# Altium footprint library XU-GENARAL PCB .PcbLib: 1176 footprints (part 1 of 75)
Each footprint in its own frame and in the unit in brackets; x right, y up, seen from the top. Pads: shape width x height; smd on the part's side, far side on the other; paste and mask are expansions set on the pad; w line width, h text height; cw(c..) or ccw(c..) is an arc to the next point about the centre after c.
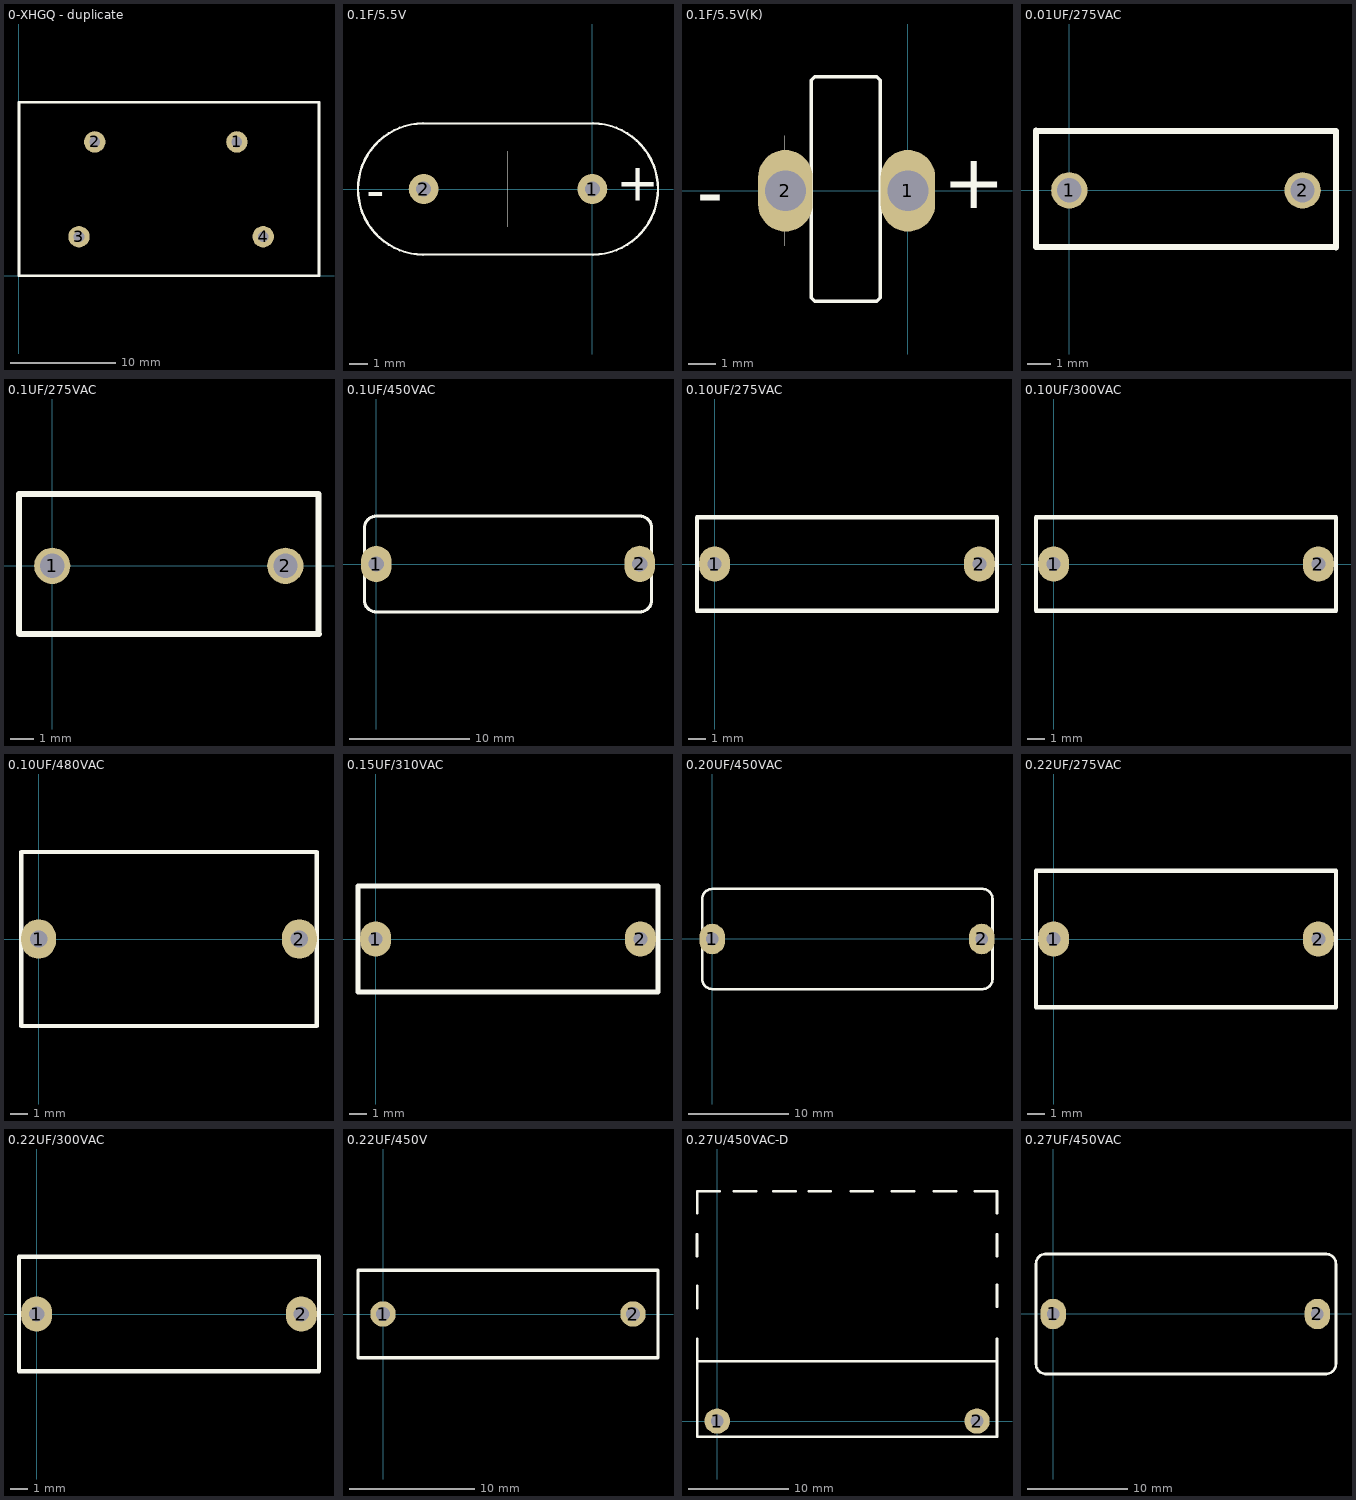
[diagram p0: the footprints below, top view; thin cyan lines are the x and y axes]

## 0-XHGQ - duplicate [mil]
pads (4):
  round 80 hole 40: 1(814.83,500.91) 2(283.33,500.91) 3(224.28,146.57) 4(913.25,146.57)
Top Overlay:
  lines w10: 0,0 1122.05,0 1122.05,649.61 0,649.61 0,0

## 0.1F/5.5V [mm]
pads (2):
  round 1.6 hole 0.8: 1(0,0) 2(-9,0)
Top Overlay:
  rectangle: -4.532,-2.032 -4.532,2.032
  lines w0.127: -0.284,-3.497 ccw(c0,0) -0.284,3.497 -8.716,3.497 ccw(c-9,0) -8.716,-3.497 -0.195,-3.497
  text "-" at -12.065,-1.016 h2
  text "+" at 1.27,-0.635 h2

## 0.1F/5.5V(K) [mm]
pads (2):
  oval 2x3 hole 1.5: 1(0,0) 2(-4.5,0)
Top Overlay:
  rectangle: -4.532,-2.032 -4.532,2.032
  lines w0.127: -3.556,-3.937 -3.429,-4.064 -1.143,-4.064 -1.016,-3.937 -1.016,4.064 -1.143,4.191 -3.429,4.191 -3.556,4.064 -3.556,-3.937
  text "-" at -7.747,-1.016 h2
  text "+" at 1.27,-0.635 h2

## 0.01UF/275VAC [mil]
pads (2):
  round 60 hole 40: 1(0,0) 2(385.83,0)
Top Overlay:
  lines w10: -55,98.91 -55,-94 440.51,-94 ; -54.51,98.42 441,98.42 441,-94.49

## 0.1UF/275VAC [mil]
pads (2):
  round 60 hole 40: 1(0,0) 2(385.83,0)
Top Overlay:
  lines w10: -55,-112 -55,-94 -55,98.91 -55,119 440.51,119 ; -54,-113 441.51,-113 ; 441,-112.49 441,-94.49 441,98.42 441,118.51

## 0.1UF/450VAC [mil]
pads (2):
  oval 100x120 hole 50: 1(0,0) 2(866.14,0.01)
Top Overlay:
  lines w10: -39.37,117 cw(c0.56,117.56) 0,157.48 866.14,157.48 cw(c866.14,118.11) 905.51,118.11 905.51,-118.11 cw(c866.14,-118.11) 866.14,-157.48 0,-157.48 cw(c0,-118.11) -39.37,-118.11 -39.37,118.11

## 0.10UF/275VAC [mil]
pads (2):
  oval 70x80 hole 32: 1(0,0) 2(600,0)
Top Overlay:
  lines w10: -40,-106 640,-106 640,106 -40,106 -40,-106

## 0.10UF/300VAC [mil]
pads (2):
  oval 70x80 hole 32: 1(0,0) 2(600,0)
Top Overlay:
  lines w10: -40,-106 640,-106 640,106 -40,106 -40,-106

## 0.10UF/480VAC [mil]
pads (2):
  oval 80x90 hole 40: 1(0,0) 2(600,0)
Top Overlay:
  lines w10: -40,-200 -40,200 640,200 640,-200 -40,-200

## 0.15UF/310VAC [mil]
pads (2):
  oval 70x80 hole 32: 1(0,0) 2(600,0)
Top Overlay:
  lines w12: -40,-120 -40,120 640,120 640,-120 -40,-120

## 0.20UF/450VAC [mil]
pads (2):
  oval 100x120 hole 50: 1(0,0) 2(1060,0.01)
Top Overlay:
  lines w10: -39.37,-157.48 ccw(c0,-157.48) 0,-196.85 1062.99,-196.85 ccw(c1062.99,-157.48) 1102.36,-157.48 1102.36,157.48 ccw(c1062.99,157.48) 1062.99,196.85 0,196.85 ccw(c0,157.48) -39.37,157.48 -39.37,-157.48

## 0.22UF/275VAC [mil]
pads (2):
  oval 70x80 hole 32: 1(0,0) 2(600,0)
Top Overlay:
  lines w10: -40,-155 -40,155 640,155 640,-155 -40,-155

## 0.22UF/300VAC [mil]
pads (2):
  oval 70x80 hole 35: 1(0,0) 2(600,0)
Top Overlay:
  lines w10: -40,-130 -40,130 640,130 640,-130 -40,-130

## 0.22UF/450V [mil]
pads (2):
  round 80 hole 45: 1(0,0) 2(787.4,0)
Top Overlay:
  lines w10: -78.74,-137.8 -78.74,0 -78.74,137.8 866.14,137.8 866.14,-137.8 -78.74,-137.8

## 0.27U/450VAC-D [mm]
pads (2):
  round 2.54 hole 1.27: 1(0,0) 2(26,0)
Top Overlay:
  lines w0.254: -2.025,16.475 -2.025,18.7 ; -2,6.025 -2,8.25 ; -2,11.3 -2,13.525 ; -2,20.775 -2,23 0.225,23 ; 1.675,23 3.9,23 ; 5.625,23 7.85,23 ; 9.15,23 11.375,23 ; 13.35,23 15.575,23 ; 17.475,23 19.7,23 ; 21.675,23 23.9,23 ; 25.775,23 28,23 28,20.775 ; 28,8.225 28,6 ; 28,11.425 28,13.65 ; 28,16.475 28,18.7 ; 28,6 28,-1.575 -2,-1.575 -2,6 28,6

## 0.27UF/450VAC [mil]
pads (2):
  oval 100x120 hole 50: 1(0,0) 2(1040,0)
Top Overlay:
  lines w10: -31.5,-236.22 1074.8,-236.22 ccw(c1072.47,-195.33) 1113.36,-193 ; -30,-236.22 cw(c-29.19,-197.67) -67.74,-196.85 -67.74,196.85 cw(c-29.93,198.41) -31.5,236.22 1074.8,236.22 ; 1074,236.22 cw(c1074,196.85) 1113.36,196.85 1113.36,-196.85